# Altium footprint library SMT.PcbLib: 325 footprints (part 5 of 21)
Each footprint in its own frame and in the unit in brackets; x right, y up, seen from the top. Pads: shape width x height; smd on the part's side, far side on the other; paste and mask are expansions set on the pad; w line width, h text height; cw(c..) or ccw(c..) is an arc to the next point about the centre after c.
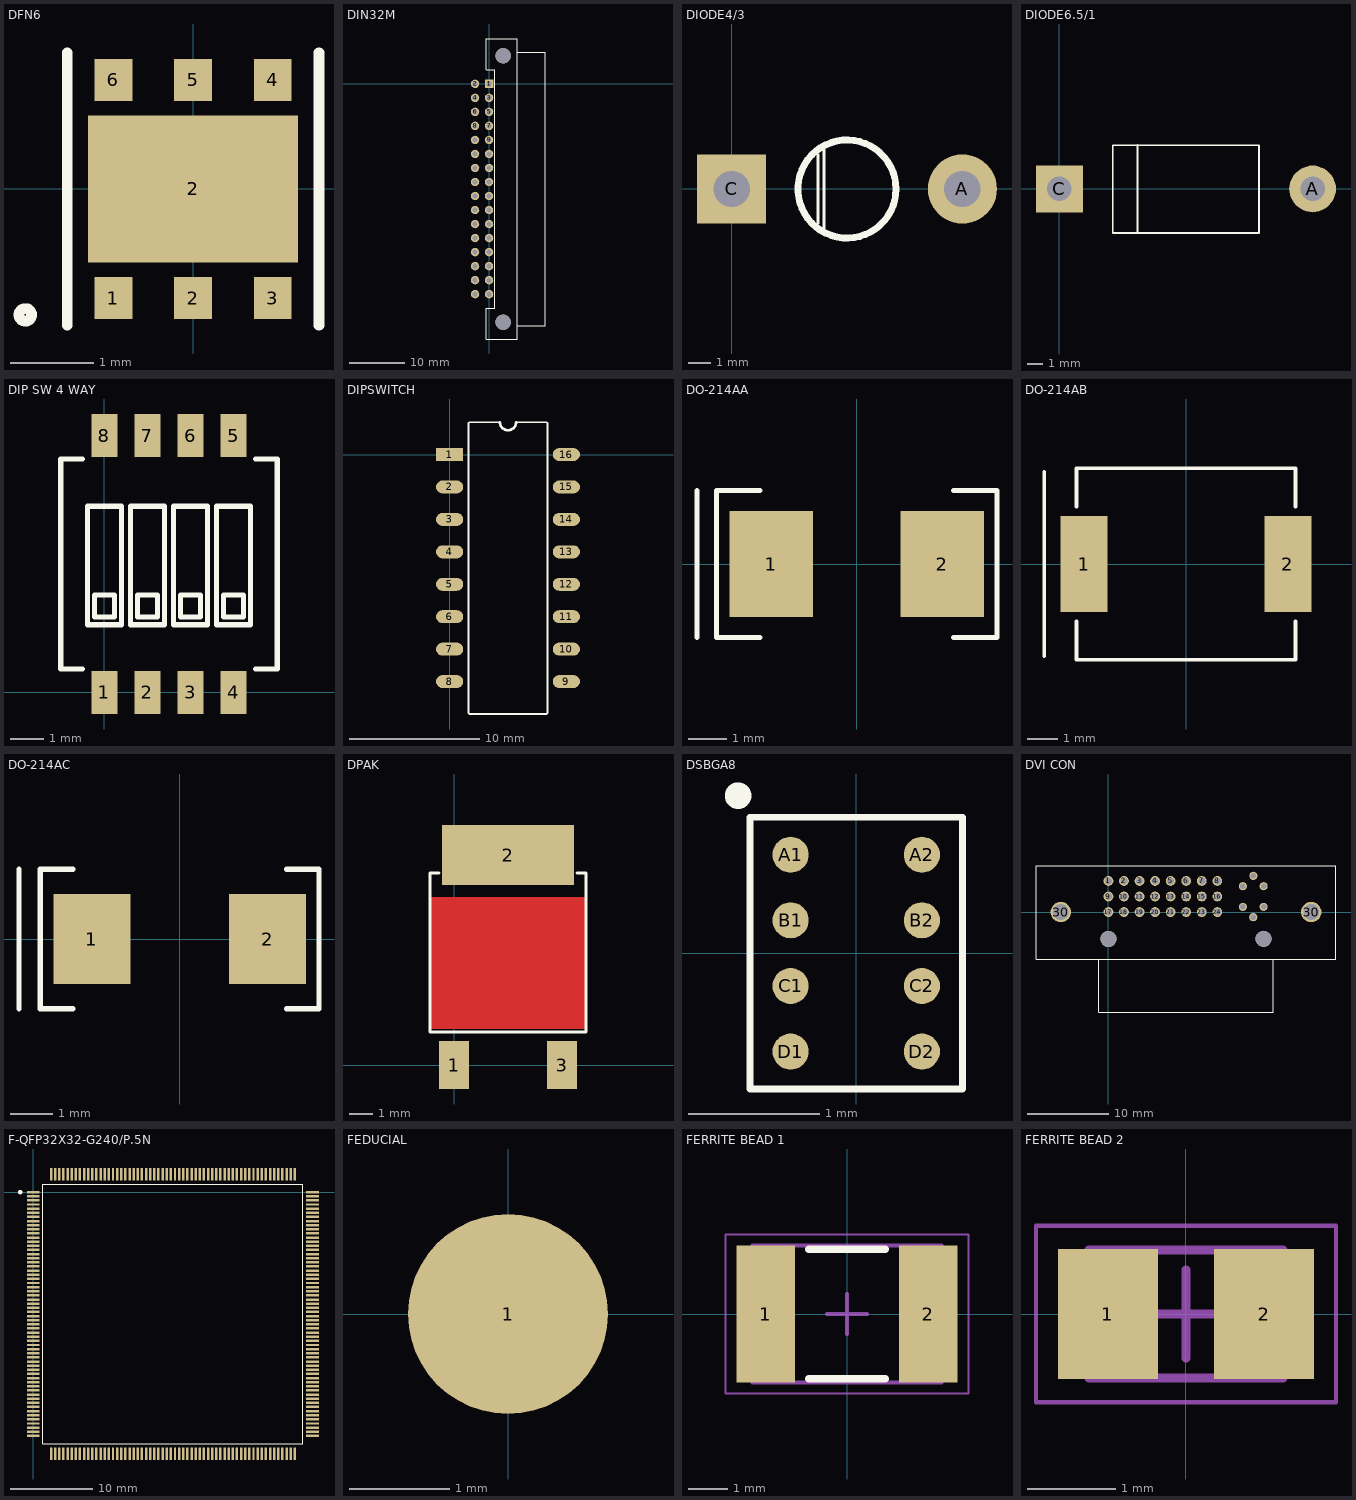
[diagram p4: the footprints below, top view; thin cyan lines are the x and y axes]

## DFN6 [mm] "(3X3 mm)"
height 1
pads (7):
  rect 0.45x0.5 smd: 1(-0.95,-1.3) 2(0,-1.3) 3(0.95,-1.3) 4(0.95,1.3) 5(0,1.3) 6(-0.95,1.3)
  rect 2.5x1.75 smd: 2(0,0)
TopOverlay:
  circle w0.127: c-2,-1.5 r0.075
  lines w0.127: -1.5,-1.625 -1.5,1.625 ; 1.5,-1.625 1.5,1.625

## DIN32M [mil]
pads (34):
  rect 60x60 hole 38: 1(0,0)
  round 60 hole 38: 2(-100,0) 3(0,-100) 4(-100,-100) 5(0,-200) 6(-100,-200) 7(0,-300) 8(-100,-300) 9(0,-400) 10(-100,-400) 11(0,-500) 12(-100,-500) 13(0,-600) 14(-100,-600) 15(0,-700) 16(-100,-700) 17(0,-800) 18(-100,-800) 19(0,-900) 20(-100,-900) 21(0,-1000) 22(-100,-1000) 23(0,-1100) 24(-100,-1100) 25(0,-1200) 26(-100,-1200) 27(0,-1300) 28(-100,-1300) 29(0,-1400) 30(-100,-1400) 31(0,-1500) 32(-100,-1500)
  round 109 hole 110: ""(100,-1700) ""(100,200)
TopOverlay:
  lines w5: 200,-1725 400,-1725 400,225 200,225 ; -20,-1820 -20,-1600 40,-1600 40,100 -20,100 -20,320 200,320 200,-1820 -20,-1820

## DIODE4/3 [mil]
pads (2):
  round 120 hole 63: A(400,0)
  rect 120x120 hole 63: C(0,0)
TopOverlay:
  circle w12: c200,0 r85
  lines w5: 150,-60 150,60 ; 160,-70 160,70

## DIODE6.5/1 [mil]
pads (2):
  round 120 hole 63: A(650,0)
  rect 120x120 hole 63: C(0,0)
TopOverlay:
  lines w5: 200,-112.5 200,112.5 ; 137,-113 512,-113 512,112 137,112 137,-113

## DIP SW 4 WAY [mm] "GDH SERIES"
height 0.059
pads (8):
  rect 0.76x1.27 smd: 1(0,0) 2(1.27,0) 3(2.54,0) 4(3.81,0) 5(3.81,7.59) 6(2.54,7.59) 7(1.27,7.59) 8(0,7.59)
TopOverlay:
  lines w0.152: -0.645,0.695 -1.29,0.695 -1.29,6.895 -0.645,6.895 ; 4.455,0.695 5.1,0.695 5.1,6.895 4.455,6.895 ; -0.5,2 0.5,2 0.5,5.5 -0.5,5.5 -0.5,2 ; -0.3,2.225 0.3,2.225 0.3,2.875 -0.3,2.875 -0.3,2.225 ; 0.77,2 0.77,5.5 1.77,5.5 1.77,2 0.77,2 ; 0.97,2.225 0.97,2.875 1.57,2.875 1.57,2.225 0.97,2.225 ; 2.04,2 2.04,5.5 3.04,5.5 3.04,2 2.04,2 ; 2.24,2.225 2.24,2.875 2.84,2.875 2.84,2.225 2.24,2.225 ; 3.31,2 3.31,5.5 4.31,5.5 4.31,2 3.31,2 ; 3.51,2.225 3.51,2.875 4.11,2.875 4.11,2.225 3.51,2.225
3D body: height 2.31, standoff 0, extent -1.35,0.6 5.175,6.975

## DIPSWITCH [mm]
pads (16):
  rect 2.1x1 smd: 1(0,0)
  oval 2.1x1 smd: 2(0,-2.5) 3(0,-5) 4(0,-7.5) 5(0,-10) 6(0,-12.5) 7(0,-15) 8(0,-17.5) 9(9,-17.5) 10(9,-15) 11(9,-12.5) 12(9,-10) 13(9,-7.5) 14(9,-5) 15(9,-2.5) 16(9,0)
TopOverlay:
  lines w0.127: 1.452,-19.926 1.452,2.426 ; 1.535,-20 7.465,-20 ; 1.535,2.5 3.875,2.5 ; 5.125,2.5 7.465,2.5 ; 7.548,-19.926 7.548,2.426
  lines w0.2: 3.875,2.5 ccw(c4.5,2.5) 5.125,2.5

## DO-214AA [mm]
pads (2):
  rect 2.159x2.743 smd: 1(-2.21,0) 2(2.21,0)
TopOverlay:
  lines w0.127: -4.125,-1.9 -4.125,1.9 ; -2.5,-1.9 -3.625,-1.9 -3.625,1.9 -2.5,1.9 ; 2.5,-1.9 3.625,-1.9 3.625,1.9 2.5,1.9
3D body: height 2.2, standoff 0, extent -2.725,-1.775 2.725,1.775

## DO-214AB [mm] "SMC footprint"
height 2.45
pads (2):
  rect 1.54x3.14 smd: 1(-3.325,0) 2(3.325,0)
TopOverlay:
  lines w0.127: -4.625,-3 -4.625,3 ; -3.575,-1.875 -3.575,-3.125 0,-3.125 3.575,-3.125 3.575,-1.875 ; -3.575,1.875 -3.575,3.125 0,3.125 3.575,3.125 3.575,1.875
3D body: height 2.46, standoff 2.45, extent -2.5,-3.125 -2,3.125
3D body: height 2.45, standoff 0, extent -3.575,-3.125 3.575,3.125

## DO-214AC [mm]
height 2.29
pads (2):
  rect 1.8x2.1 smd: 1(-2.05,0) 2(2.05,0)
TopOverlay:
  lines w0.127: -3.75,-1.625 -3.75,1.625 ; -2.5,-1.625 -3.25,-1.625 -3.25,1.625 -2.5,1.625 ; 2.5,-1.625 3.25,-1.625 3.25,1.625 2.5,1.625
3D body: height 2.2, standoff 0, extent -2.3,-1.375 2.3,1.375

## DPAK [mil]
pads (3):
  rect 50x80 smd: 1(0,0) 3(180,0)
  rect 220x100 smd: 2(90,350)
TopLayer:
  rectangle: -40,60 220,280
TopOverlay:
  lines w5: -25,320 -40,320 -40,55 220,55 220,320 205,320

## DSBGA8 [mm] "8 WAY BALL GRID ARRAY"
height 0.675
pads (8):
  round 0.275 smd: A1(-0.5,0.75) A2(0.5,0.75) B1(-0.5,0.25) B2(0.5,0.25) C1(-0.5,-0.25) C2(0.5,-0.25) D1(-0.5,-0.75) D2(0.5,-0.75)
TopOverlay:
  circle w0.102: c-0.9,1.2 r0.051
  lines w0.051: -0.81,-1.035 0.81,-1.035 0.81,1.035 -0.81,1.035 -0.81,-1.035
3D body: height 0.67, standoff 0.22, extent -0.813,-1.041 0.813,1.041

## DVI CON [mm]
pads (34):
  round 1.2 hole 0.86: 1(0,3.82) 2(1.91,3.82) 3(3.82,3.82) 4(5.73,3.82) 5(7.64,3.82) 6(9.55,3.82) 7(11.46,3.82) 8(13.37,3.82) 9(0,1.91) 10(1.91,1.91) 11(3.82,1.91) 12(5.73,1.91) 13(7.64,1.91) 14(9.55,1.91) 15(11.46,1.91) 16(13.37,1.91) 17(0,0) 18(1.91,0) 19(3.82,0) 20(5.73,0) 21(7.64,0) 22(9.55,0) 23(11.46,0) 24(13.37,0)
  round 1 hole 0.66: 25(16.51,3.175) 26(19.05,3.175) 27(16.51,0.635) 28(19.05,0.635) 29(17.78,-0.63) 29(17.79,4.45)
  round 2.5 hole 1.93: 30(-5.84,0) 30(24.89,0)
  round 2 hole 1.93 unplated: ""(0,-3.3) ""(19.05,-3.29)
TopOverlay:
  lines w0.127: -1.16,-5.82 -1.16,-12.33 20.21,-12.32 20.21,-5.81 ; -8.89,-5.82 27.94,-5.82 27.94,5.715 -8.89,5.715 -8.89,-5.82

## F-QFP32X32-G240/P.5N [mm]
pads (240):
  rect 1.55x0.3 smd: 1(0,0) 2(0,-0.5) 3(0,-1) 4(0,-1.5) 5(0,-2) 6(0,-2.5) 7(0,-3) 8(0,-3.5) 9(0,-4) 10(0,-4.5) 11(0,-5) 12(0,-5.5) 13(0,-6) 14(0,-6.5) 15(0,-7) 16(0,-7.5) 17(0,-8) 18(0,-8.5) 19(0,-9) 20(0,-9.5) 21(0,-10) 22(0,-10.5) 23(0,-11) 24(0,-11.5) 25(0,-12) 26(0,-12.5) 27(0,-13) 28(0,-13.5) 29(0,-14) 30(0,-14.5) 31(0,-15) 32(0,-15.5) 33(0,-16) 34(0,-16.5) 35(0,-17) 36(0,-17.5) 37(0,-18) 38(0,-18.5) 39(0,-19) 40(0,-19.5) 41(0,-20) 42(0,-20.5) 43(0,-21) 44(0,-21.5) 45(0,-22) 46(0,-22.5) 47(0,-23) 48(0,-23.5) 49(0,-24) 50(0,-24.5) 51(0,-25) 52(0,-25.5) 53(0,-26) 54(0,-26.5) 55(0,-27) 56(0,-27.5) 57(0,-28) 58(0,-28.5) 59(0,-29) 60(0,-29.5) 121(33.8,-29.5) 122(33.8,-29) 123(33.8,-28.5) 124(33.8,-28) 125(33.8,-27.5) 126(33.8,-27) 127(33.8,-26.5) 128(33.8,-26) 129(33.8,-25.5) 130(33.8,-25) 131(33.8,-24.5) 132(33.8,-24) 133(33.8,-23.5) 134(33.8,-23) 135(33.8,-22.5) 136(33.8,-22) 137(33.8,-21.5) 138(33.8,-21) 139(33.8,-20.5) 140(33.8,-20) 141(33.8,-19.5) 142(33.8,-19) 143(33.8,-18.5) 144(33.8,-18) 145(33.8,-17.5) 146(33.8,-17) 147(33.8,-16.5) 148(33.8,-16) 149(33.8,-15.5) 150(33.8,-15) 151(33.8,-14.5) 152(33.8,-14) 153(33.8,-13.5) 154(33.8,-13) 155(33.8,-12.5) 156(33.8,-12) 157(33.8,-11.5) 158(33.8,-11) 159(33.8,-10.5) 160(33.8,-10) 161(33.8,-9.5) 162(33.8,-9) 163(33.8,-8.5) 164(33.8,-8) 165(33.8,-7.5) 166(33.8,-7) 167(33.8,-6.5) 168(33.8,-6) 169(33.8,-5.5) 170(33.8,-5) 171(33.8,-4.5) 172(33.8,-4) 173(33.8,-3.5) 174(33.8,-3) 175(33.8,-2.5) 176(33.8,-2) 177(33.8,-1.5) 178(33.8,-1) 179(33.8,-0.5) 180(33.8,0)
  rect 0.3x1.55 smd: 61(2.15,-31.65) 62(2.65,-31.65) 63(3.15,-31.65) 64(3.65,-31.65) 65(4.15,-31.65) 66(4.65,-31.65) 67(5.15,-31.65) 68(5.65,-31.65) 69(6.15,-31.65) 70(6.65,-31.65) 71(7.15,-31.65) 72(7.65,-31.65) 73(8.15,-31.65) 74(8.65,-31.65) 75(9.15,-31.65) 76(9.65,-31.65) 77(10.15,-31.65) 78(10.65,-31.65) 79(11.15,-31.65) 80(11.65,-31.65) 81(12.15,-31.65) 82(12.65,-31.65) 83(13.15,-31.65) 84(13.65,-31.65) 85(14.15,-31.65) 86(14.65,-31.65) 87(15.15,-31.65) 88(15.65,-31.65) 89(16.15,-31.65) 90(16.65,-31.65) 91(17.15,-31.65) 92(17.65,-31.65) 93(18.15,-31.65) 94(18.65,-31.65) 95(19.15,-31.65) 96(19.65,-31.65) 97(20.15,-31.65) 98(20.65,-31.65) 99(21.15,-31.65) 100(21.65,-31.65) 101(22.15,-31.65) 102(22.65,-31.65) 103(23.15,-31.65) 104(23.65,-31.65) 105(24.15,-31.65) 106(24.65,-31.65) 107(25.15,-31.65) 108(25.65,-31.65) 109(26.15,-31.65) 110(26.65,-31.65) 111(27.15,-31.65) 112(27.65,-31.65) 113(28.15,-31.65) 114(28.65,-31.65) 115(29.15,-31.65) 116(29.65,-31.65) 117(30.15,-31.65) 118(30.65,-31.65) 119(31.15,-31.65) 120(31.65,-31.65) 181(31.65,2.15) 182(31.15,2.15) 183(30.65,2.15) 184(30.15,2.15) 185(29.65,2.15) 186(29.15,2.15) 187(28.65,2.15) 188(28.15,2.15) 189(27.65,2.15) 190(27.15,2.15) 191(26.65,2.15) 192(26.15,2.15) 193(25.65,2.15) 194(25.15,2.15) 195(24.65,2.15) 196(24.15,2.15) 197(23.65,2.15) 198(23.15,2.15) 199(22.65,2.15) 200(22.15,2.15) 201(21.65,2.15) 202(21.15,2.15) 203(20.65,2.15) 204(20.15,2.15) 205(19.65,2.15) 206(19.15,2.15) 207(18.65,2.15) 208(18.15,2.15) 209(17.65,2.15) 210(17.15,2.15) 211(16.65,2.15) 212(16.15,2.15) 213(15.65,2.15) 214(15.15,2.15) 215(14.65,2.15) 216(14.15,2.15) 217(13.65,2.15) 218(13.15,2.15) 219(12.65,2.15) 220(12.15,2.15) 221(11.65,2.15) 222(11.15,2.15) 223(10.65,2.15) 224(10.15,2.15) 225(9.65,2.15) 226(9.15,2.15) 227(8.65,2.15) 228(8.15,2.15) 229(7.65,2.15) 230(7.15,2.15) 231(6.65,2.15) 232(6.15,2.15) 233(5.65,2.15) 234(5.15,2.15) 235(4.65,2.15) 236(4.15,2.15) 237(3.65,2.15) 238(3.15,2.15) 239(2.65,2.15) 240(2.15,2.15)
TopOverlay:
  circle w0.25: c-1.575,0 r0.15
  lines w0.127: 1.175,-30.475 32.625,-30.475 32.625,0.975 1.175,0.975 1.175,-30.475

## FEDUCIAL [mm]
pads (1):
  round 2 smd: 1(0,0)
DrillDrawing:
  lines w0.127: -1.5,0 1.5,0 ; 0,-1.5 0,1.5

## FERRITE BEAD 1 [mm] "HI1812V101R-10"
height 2.3
pads (2):
  rect 1.47x3.45 smd: 1(-2.04,0) 2(2.04,0)
TopOverlay:
  lines w0.2: -0.95,-1.625 0.95,-1.625 ; -0.95,1.625 0.95,1.625
Mechanical13:
  lines w0.1: -2.375,-1.725 -2.375,1.725 2.375,1.725 2.375,-1.725 -2.375,-1.725
Mechanical15:
  lines w0.05: -3.05,-2 -3.05,2 3.05,2 3.05,-2 -3.05,-2
  lines w0.1: -0.5,0 0.5,0 ; 0,-0.5 0,0.5
3D body: height 2.3, standoff 0, extent -1.695,-1.725 1.695,1.725
3D body: height 2.3, standoff 0, extent -2.375,-1.725 -1.695,1.725
3D body: height 2.3, standoff 0, extent 1.695,-1.725 2.375,1.725

## FERRITE BEAD 2 [mm] "Chip Inductor, 2-Leads, Body 2.00x1.25mm, IPC Medium Density"
height 0.85
pads (2):
  rect 1.13x1.47 smd: 1(-0.885,0) 2(0.885,0)
Mechanical13:
  lines w0.1: -1.1,-0.725 -1.1,0.725 1.1,0.725 1.1,-0.725 -1.1,-0.725
Mechanical15:
  lines w0.05: -1.7,-1 -1.7,1 1.7,1 1.7,-1 -1.7,-1
  lines w0.1: -0.5,0 0.5,0 ; 0,-0.5 0,0.5
3D body: height 0.85, standoff 0, extent -0.6,-0.725 0.6,0.725
3D body: height 0.85, standoff 0, extent -1.1,-0.725 -0.6,0.725
3D body: height 0.85, standoff 0, extent 0.6,-0.725 1.1,0.725